# Altium integrated library PCB_Project1.IntLib: 16 symbols
Pins are listed as number, name and electrical type; pins without a type are passive.

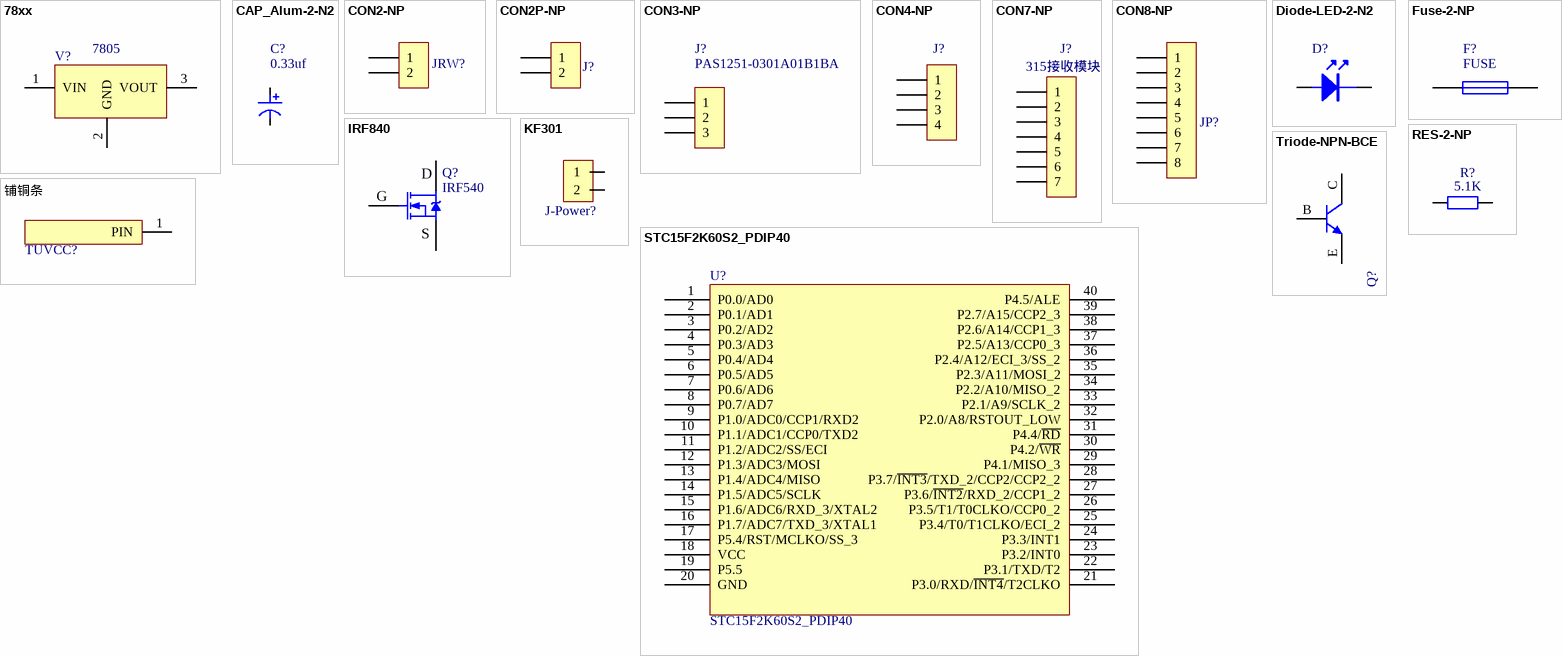
[diagram p0: symbols 78xx to 铺铜条]

## 78xx
designator V?, comment 7805
线性稳压芯片; 版权归属: 源创客; BOM名称: 线性稳压芯片; 学习资源: www.ooocke.com
footprint TO252 (252晶体管)
footprint TO220A (220，3脚晶体管)
footprint TO220B (220，3脚晶体管)
footprint TO220C (220，3脚晶体管)
pins: 1 VIN, 2 GND, 3 VOUT

## CAP_Alum-2-N2
designator C?, comment 0.33uf
DIP,电容量681pf,额定电压2000V,偏差±10%,6.5X5mm; Part Number: 102CB-00002OD.01; Allow Altenative Part: Y; serial number: 14; Categories: 电容; Value: 681pF; Tolerance: ±10%; Rated Voltage: 2000V; COMPONENTLINK 1 DESCRIPTION: ShowDatasheet; Remark: Verified by BU1（黄雄青） check list V1.0; Modify time: 2015年11月05号; Approved: YES; Category: 陶瓷电容; Operating Temperature: -25°C~105°C; PACKAGE: Bulk; Mounting Type: ThroughHole; Applications: Automotive; Size: 6.5; Max Thickness: 5; Supplier 1: TDK; Supplier Part Number 1: CK45-B3DD681KYLR; Pricing 1: 0.7242; COMPONENTLINK 1 URL: http://pdf-file.ic37.com/pdf6/TDK/CK45-B3DD222KYNA_datasheet_1118532/182787/CK45-B_datasheet.pdf; MOQ: 1000
footprint CAP 1.5*4*8 (脚距1.5mm直径4mm高度8mm)
footprint CE5-6R5X5-1mm
pins: 1, 2

## CON2-NP
designator JRW?, comment 62000211121  (value not drawn)
DIP,封装脚距2mm,180度,1x2PIN,黑色; Part Number: 102NL-00015BV.01; Allow Altenative Part: Y; serial number: 164; Categories: 连接器; COMPONENTLINK 1 DESCRIPTION: GetDatasheet; Remark: Verified by CRD（赖程奇） check list V1.0; Modify time: 2015年07月10号; Approved: YES; Category: 单排针; Value: 62000211121; PACKAGE: Bulk; Mounting Type: ThroughHole; Supplier 1: wurth; Supplier Part Number 1: 62000211121; Pricing 1: .98; COMPONENTLINK 1 URL: http://katalog.we-online.de/en/em/620_0xx_111_21/620_032_111_21?m=n&sp=http%3A%2F%2Fwww.we-online.com%2Fweb%2Fen%2Fwuerth_elektronik%2Fsearchpage.php%3Fsearch%3D62003211121; MOQ: 500
footprint CON2P-2R0-TH
pins: 1, 2

## CON2P-NP
designator J?, comment PAS1251-0201A01B1BA  (value not drawn)
DIP,封装脚距2.54mm,180度,1x2PIN,上针/下针6.0/3.0mm,黑色; Part Number: 102NL-00005DJ.01; Allow Altenative Part: Y; serial number: 286; Categories: 连接器; COMPONENTLINK 1 DESCRIPTION: GetDatasheet; Remark: Verified by BU2（叶俊雄） check list V1.0; Modify time: 2016年08月22号; Approved: YES; Category: 单排针; Value: PAS1251-0201A01B1BA; PACKAGE: Bulk; Mounting Type: ThroughHole; Supplier 1: 骏佳; Supplier Part Number 1: PAS1251-0201A01B1BA; Pricing 1: .03; COMPONENTLINK 1 URL: http://www.hkjb888.com/product.asp?action=detailed&id=1099&page=3&pid=245; MOQ: 500
footprint CON2P-2R54-TH
pins: 1, 2

## CON3-NP
designator J?, comment PAS1251-0301A01B1BA
DIP,封装脚距2.54mm,180度,1x3PIN,黑色; Part Number: 102NL-00001DJ.01; Allow Altenative Part: Y; serial number: 168; Categories: 连接器; COMPONENTLINK 1 DESCRIPTION: GetDatasheet; Remark: Verified by CRD（赖程奇） check list V1.0; Modify time: 2016年1月11号; Approved: YES; Category: 单排针; Value: PAS1251-0301A01B1BA; PACKAGE: Bulk; Mounting Type: ThroughHole; Supplier 1: 骏佳; Supplier Part Number 1: PAS1251-0301A01B1BA; Pricing 1: 2.05; COMPONENTLINK 1 URL: http://www.hkjb888.com/product.asp?page=7; MOQ: 100
footprint CON3P-2R54-TH
pins: 1, 2, 3

## CON4-NP
designator J?, comment 61300411121  (value not drawn)
DIP,封装脚距2.54mm,180度,1x4PIN,黑色; Part Number: 102NL-00004BV.01; Allow Altenative Part: Y; serial number: 603; Categories: 连接器; COMPONENTLINK 1 DESCRIPTION: GetDatasheet; Remark: Verified by CRD（赖程奇） check list V1.0; Modify time: 2015年07月10号; Approved: YES; Category: 单排针; Value: 61300411121; PACKAGE: Bulk; Mounting Type: ThroughHole; Supplier 1: wurth; Supplier Part Number 1: 61300411121; Pricing 1: 1.21; COMPONENTLINK 1 URL: http://katalog.we-online.de/en/em/620_0xx_111_21/620_032_111_21?m=n&sp=http%3A%2F%2Fwww.we-online.com%2Fweb%2Fen%2Fwuerth_elektronik%2Fsearchpage.php%3Fsearch%3D62003211121; MOQ: 500
footprint CON4P-2R54-TH
pins: 1, 2, 3, 4

## CON7-NP
designator J?, comment 315接收模块
DIP,封装脚距2.54mm,180度,1x7PIN,黑色; Part Number: 102NL-00032BV.01; Allow Altenative Part: Y; serial number: 165; Categories: 连接器; Value: 61300711121; COMPONENTLINK 1 DESCRIPTION: GetDatasheet; Remark: Verified by CRD（赖程奇） check list V1.0; Modify time: 2015年07月10号; Approved: YES; Category: 单排针; PACKAGE: Bulk; Mounting Type: ThroughHole; Supplier 1: wurth; Supplier Part Number 1: 61300711121; Pricing 1: 2.05; COMPONENTLINK 1 URL: http://katalog.we-online.de/en/em/620_0xx_111_21/620_032_111_21?m=n&sp=http%3A%2F%2Fwww.we-online.com%2Fweb%2Fen%2Fwuerth_elektronik%2Fsearchpage.php%3Fsearch%3D62003211121; MOQ: 500
footprint CON7P-2R54-TH
pins: 1, 2, 3, 4, 5, 6, 7

## CON8-NP
designator JP?, comment SSW-108-22-L-S-VS  (value not drawn)
DIP,封装脚距2.54mm,180度,1x8PIN,塑高/针长8.5/4.93mm,黑色; Part Number: 102NM-00001BF.01; Allow Altenative Part: Y; serial number: 158; Categories: 连接器; COMPONENTLINK 1 DESCRIPTION: GetDatasheet; Remark: Verified by CRD（赖程奇） check list V1.0; Modify time: 2015年11月06号; Approved: YES; Category: 单排母; Value: SSW-108-22-L-S-VS; PACKAGE: Bulk; Mounting Type: ThroughHole; Supplier 1: Samtec; Supplier Part Number 1: SSW-108-22-L-S-VS; Pricing 1: 1.67; COMPONENTLINK 1 URL: https://wwws.samtec.com/; MOQ: 100
footprint CON8R-2R54-TH
pins: 1, 2, 3, 4, 5, 6, 7, 8

## Diode-LED-2-N2
designator D?, comment 333-2SYGD/S530-E2  (value not drawn)
DIP,封装/间距直径5/2.54mm,额定电压2V,亮度普亮,绿色; Part Number: 102DL-00010CH.01; Allow Altenative Part: Y; serial number: 4; Categories: 二极管; Rated Voltage: 2V; COMPONENTLINK 1 DESCRIPTION: GetDatasheet; Remark: Verified by CRD（张宗良） check list V1.0; Modify time: 2015年11月11号; Approved: YES; Category: 发光二极管; Value: 333-2SYGD/S530-E2; Other: 绿色; PACKAGE: Bulk; Mounting Type: ThroughHole; Supplier 1: 台湾亿光; Supplier Part Number 1: 333-2SYGD/S530-E2; Pricing 1: .3619; COMPONENTLINK 1 URL: http://www.everlight.com/file/ProductFile/201407052217358844.pdf; MOQ: 4000
footprint LED2-D5R9X8R7
pins: 1, 2

## Fuse-2-NP
designator F?, comment FUSE
DIP,24.1x29.7x3.0mm,额定电压30V,额定电流9A,触发电流18A,中速断; Part Number: 102FP-00037BI.01; Allow Altenative Part: Y; serial number: 2; Categories: 保险丝; Value: R30-900; Rated Voltage: 30V; Rated Current: 9A; COMPONENTLINK 1 DESCRIPTION: GetDatasheet; Remark: Verified by BU1（黄雄青） check list V1.0; Modify time: 2015年07月10号; Approved: YES; Category: 自恢复保险丝; PACKAGE: Bulk; Mounting Type: ThroughHole; Supplier 1: SEA&LAND; Supplier Part Number 1: R30-900; Pricing 1: .4; COMPONENTLINK 1 URL: http://www.littelfuse.name/te_product_d_c914/2013-10-18/7630.chtml; MOQ: 500
footprint FUSE-24R1X3RX29R7-TH
pins: 1, 2

## IRF840
designator Q?, comment IRF540
N沟场效应管; 版权归属: 源创客; BOM名称: N沟场效应管; 学习资源: www.ooocke.com
footprint TO220A (220，3脚晶体管)
footprint TO220B (220，3脚晶体管)
footprint TO220C (220，3脚晶体管)
pins: 1 G, 2 D, 3 S

## KF301
designator J-Power?, comment KF301-5.08-2p  (value not drawn)
footprint KF301-5.0-2P (可拼接端子/6A)
pins: 1, 2

## RES-2-NP
designator R?, comment 5.1K
DIP,阻值5.1K,精度±1%,6.2x2.29mm,额定功率1/4W; Part Number: 102RO-00048BS.01; Allow Altenative Part: Y; serial number: 10; Categories: 电阻; Tolerance: ±1%; Rated Power: 1/4W; COMPONENTLINK 1 DESCRIPTION: OpenDatasheet; Remark: Verified by BU3（吴明徽）check list V1.0; Modify time: 2015年07月10号; Approved: YES; Category: 功率电阻; Value: 5.1K; PACKAGE: Bulk; Mounting Type: ThroughHole; Size: 2.29x7.5mm; Supplier 1: Vishay; Supplier Part Number 1: CCF555K10FKE36; Pricing 1: 4.48; COMPONENTLINK 1 URL: http://www.vishay.com/docs/31015/ccf55.pdf; MOQ: 5000
footprint RY0R25W
pins: 1, 2

## STC15F2K60S2_PDIP40
designator U?
footprint DIP40
pins: 1 P0.0/AD0, 2 P0.1/AD1, 3 P0.2/AD2, 4 P0.3/AD3, 5 P0.4/AD4, 6 P0.5/AD5, 7 P0.6/AD6, 8 P0.7/AD7, 9 P1.0/ADC0/CCP1/RXD2, 10 P1.1/ADC1/CCP0/TXD2, 11 P1.2/ADC2/SS/ECI, 12 P1.3/ADC3/MOSI, 13 P1.4/ADC4/MISO, 14 P1.5/ADC5/SCLK, 15 P1.6/ADC6/RXD_3/XTAL2, 16 P1.7/ADC7/TXD_3/XTAL1, 17 P5.4/RST/MCLKO/SS_3, 18 VCC, 19 P5.5, 20 GND, 21 P3.0/RXD/~{INT4}/T2CLKO, 22 P3.1/TXD/T2, 23 P3.2/INT0, 24 P3.3/INT1, 25 P3.4/T0/T1CLKO/ECI_2, 26 P3.5/T1/T0CLKO/CCP0_2, 27 P3.6/~{INT2}/RXD_2/CCP1_2, 28 P3.7/~{INT3}/TXD_2/CCP2/CCP2_2, 29 P4.1/MISO_3, 30 P4.2/~{WR}, 31 P4.4/~{RD}, 32 P2.0/A8/RSTOUT_LOW, 33 P2.1/A9/SCLK_2, 34 P2.2/A10/MISO_2, 35 P2.3/A11/MOSI_2, 36 P2.4/A12/ECI_3/SS_2, 37 P2.5/A13/CCP0_3, 38 P2.6/A14/CCP1_3, 39 P2.7/A15/CCP2_3, 40 P4.5/ALE

## Triode-NPN-BCE
designator Q?, comment 2N3904  (value not drawn)
DIP,封装形式TO-92-3,耐压值40V,额定电流200mA,耗散功率625mW; Part Number: 102GN-00009BA.01; Allow Altenative Part: Y; serial number: 1; Categories: 三极管; Rated Power: 625mW; Rated Voltage: 40V; Rated Current: 0.2A; COMPONENTLINK 1 DESCRIPTION: OpenDatasheet; Remark: Verified by BU1（吴明徽）check list V1.0; Modify time: 2015年08月08号; Approved: YES; Category: NPN三极管; Value: 2N3904; PACKAGE: Tape&Reel; Mounting Type: SurfaceMount; Size: TO-92-3; Supplier 1: ON; Supplier Part Number 1: 2N3904; Pricing 1: .17; COMPONENTLINK 1 URL: http://media.digikey.com/pdf/Data%20Sheets/ON%20Semiconductor%20PDFs/2N3903,%202N3904%20Rev4.pdf; MOQ: 1000
footprint TO-92-3-EBC-1R2
pins: B, C, E

## 铺铜条
designator TUVCC?, comment T？  (value not drawn)
2mm*20的铜条用于焊接
footprint 铺铜条
pins: 1 PIN